# Altium schematic symbol library SCHLIB.SchLib: 2608 symbols (part 16 of 20) (continued)
## R-68.1R-0402 (continued)
RES 68.1 OHM 1% 1/16W 0402; Manufacturer Part Number: RC0402FR-0768R1L; Manufacturer: YAGEO; Tolerance: 0.01; Power: 0.063W; Temperature Coefficient: ±100ppm/°C; Object  Type: Part; Design Item ID: R-68.1R-0402; Value: 68.1R; Composition: Thick Film; Features: Moisture Resistant; Operating Temperature: -55°C ~ 155°C; Height - Seated (Max): 0.40mm; Category: Resistor
footprint R0402
pins: 1, 2

## R-68.1R-0603
designator R?, comment Package: 0603  (hidden comment: 68.1R)
RES SMD 68.1 OHM 1% 1/10W 0603; Manufacturer Part Number: CRCW060368R1FKEA; Manufacturer: Vishay Dale; Tolerance: 0.01; Power: 0.1W; Temperature Coefficient: ±100ppm/°C; Object  Type: Part; Design Item ID: R-68.1R-0603; Value: 68.1R; Composition: Thick Film; Features: Automotive AEC-Q200; Operating Temperature: -55°C ~ 155°C; Height - Seated (Max): 0.50mm; Category: Resistor
footprint R0603
pins: 1, 2

## R-68K-0402
designator R?, comment Package: 0402  (hidden comment: 68K)
RES 68K OHM 1% 1/16W 0402; Manufacturer Part Number: RC0402FR-0768KL; Manufacturer: YAGEO; Tolerance: 0.01; Power: 0.063W; Temperature Coefficient: ±100ppm/°C; Object  Type: Part; Design Item ID: R-68K-0402; Value: 68K; Composition: Thick Film; Features: Moisture Resistant; Operating Temperature: -55°C ~ 155°C; Height - Seated (Max): 0.40mm; Category: Resistor
footprint R0402
pins: 1, 2

## R-68K-0603
designator R?, comment Package: 0603  (hidden comment: 68K)
RES SMD 68K OHM 1% 1/10W 0603; Manufacturer Part Number: CRCW060368K0FKEA; Manufacturer: Vishay Dale; Tolerance: 0.01; Power: 0.1W; Temperature Coefficient: ±100ppm/°C; Object  Type: Part; Design Item ID: R-68K-0603; Value: 68K; Composition: Thick Film; Features: Automotive AEC-Q200; Operating Temperature: -55°C ~ 155°C; Height - Seated (Max): 0.50mm; Category: Resistor
footprint R0603
pins: 1, 2

## R-68mR-1206
designator R?, comment Package: 1206  (hidden comment: 68mR)
RES 0.068 OHM 1% 1/4W 1206; Manufacturer Part Number: WSL1206R0680FEA; Manufacturer: Vishay Dale; Tolerance: 0.01; Power: 0.25W; Temperature Coefficient: ±75ppm/°C; Object  Type: Part; Design Item ID: R-68mR-1206; Value: 68mR; Composition: Metal Element; Features: Anti-Sulfur, Automotive AEC-Q200, Current Sense, Moisture Resistant, Pulse Withstanding; Operating Temperature: -65°C ~ 170°C; Height - Seated (Max): 0.89mm; Category: Resistor
footprint R1206
pins: 1, 2

## R-68mR-2512
designator R?, comment Package: 2512  (hidden comment: 68mR)
RES 0.068 OHM 1% 1W 2512; Manufacturer Part Number: WSL2512R0680FEA; Manufacturer: Vishay Dale; Tolerance: 0.01; Temperature Coefficient: ±75ppm/°C; Object  Type: Part; Design Item ID: R-68mR-2512; Value: 68mR; Power: 1W; Composition: Metal Element; Features: Anti-Sulfur, Automotive AEC-Q200, Current Sense, Moisture Resistant, Pulse Withstanding; Operating Temperature: -65°C ~ 170°C; Height - Seated (Max): 0.89mm; Category: Resistor
footprint R2512
pins: 1, 2

## R-68R-0402
designator R?, comment Package: 0402  (hidden comment: 68R)
RES 68 OHM 1% 1/16W 0402; Manufacturer Part Number: RC0402FR-0768RL; Manufacturer: YAGEO; Tolerance: 0.01; Power: 0.063W; Temperature Coefficient: ±100ppm/°C; Object  Type: Part; Design Item ID: R-68R-0402; Value: 68R; Composition: Thick Film; Features: Moisture Resistant; Operating Temperature: -55°C ~ 155°C; Height - Seated (Max): 0.40mm; Category: Resistor
footprint R0402
pins: 1, 2

## R-68R-0603
designator R?, comment Package: 0603  (hidden comment: 68R)
RES SMD 68 OHM 1% 1/10W 0603; Manufacturer Part Number: CRCW060368R0FKEA; Manufacturer: Vishay Dale; Tolerance: 0.01; Power: 0.1W; Temperature Coefficient: ±100ppm/°C; Object  Type: Part; Design Item ID: R-68R-0603; Value: 68R; Composition: Thick Film; Features: Automotive AEC-Q200; Operating Temperature: -55°C ~ 155°C; Height - Seated (Max): 0.50mm; Category: Resistor
footprint R0603
pins: 1, 2

## R-69.8K-0402
designator R?, comment Package: 0402  (hidden comment: 69.8K)
RES 69.8K OHM 1% 1/16W 0402; Manufacturer Part Number: RC0402FR-0769K8L; Manufacturer: YAGEO; Tolerance: 0.01; Power: 0.063W; Temperature Coefficient: ±100ppm/°C; Object  Type: Part; Design Item ID: R-69.8K-0402; Value: 69.8K; Composition: Thick Film; Features: Moisture Resistant; Operating Temperature: -55°C ~ 155°C; Height - Seated (Max): 0.40mm; Category: Resistor
footprint R0402
pins: 1, 2

## R-69.8K-0603
designator R?, comment Package: 0603  (hidden comment: 69.8K)
RES SMD 69.8K OHM 1% 1/10W 0603; Manufacturer Part Number: CRCW060369K8FKEA; Manufacturer: Vishay Dale; Tolerance: 0.01; Power: 0.1W; Temperature Coefficient: ±100ppm/°C; Object  Type: Part; Design Item ID: R-69.8K-0603; Value: 69.8K; Composition: Thick Film; Features: Automotive AEC-Q200; Operating Temperature: -55°C ~ 155°C; Height - Seated (Max): 0.50mm; Category: Resistor
footprint R0603
pins: 1, 2

## R-69.8R-0402
designator R?, comment Package: 0402  (hidden comment: 69.8R)
RES 69.8 OHM 1% 1/16W 0402; Manufacturer Part Number: RC0402FR-0769R8L; Manufacturer: YAGEO; Tolerance: 0.01; Power: 0.063W; Temperature Coefficient: ±100ppm/°C; Object  Type: Part; Design Item ID: R-69.8R-0402; Value: 69.8R; Composition: Thick Film; Features: Moisture Resistant; Operating Temperature: -55°C ~ 155°C; Height - Seated (Max): 0.40mm; Category: Resistor
footprint R0402
pins: 1, 2

## R-69.8R-0603
designator R?, comment Package: 0603  (hidden comment: 69.8R)
RES SMD 69.8 OHM 1% 1/10W 0603; Manufacturer Part Number: CRCW060369R8FKEA; Manufacturer: Vishay Dale; Tolerance: 0.01; Power: 0.1W; Temperature Coefficient: ±100ppm/°C; Object  Type: Part; Design Item ID: R-69.8R-0603; Value: 69.8R; Composition: Thick Film; Features: Automotive AEC-Q200; Operating Temperature: -55°C ~ 155°C; Height - Seated (Max): 0.50mm; Category: Resistor
footprint R0603
pins: 1, 2

## R-70mR-1206
designator R?, comment Package: 1206  (hidden comment: 70mR)
RES 0.07 OHM 1% 1/4W 1206; Manufacturer Part Number: WSL1206R0700FEA; Manufacturer: Vishay Dale; Tolerance: 0.01; Power: 0.25W; Temperature Coefficient: ±75ppm/°C; Object  Type: Part; Design Item ID: R-70mR-1206; Value: 70mR; Composition: Metal Element; Features: Anti-Sulfur, Automotive AEC-Q200, Current Sense, Moisture Resistant, Pulse Withstanding; Operating Temperature: -65°C ~ 170°C; Height - Seated (Max): 0.89mm; Category: Resistor
footprint R1206
pins: 1, 2

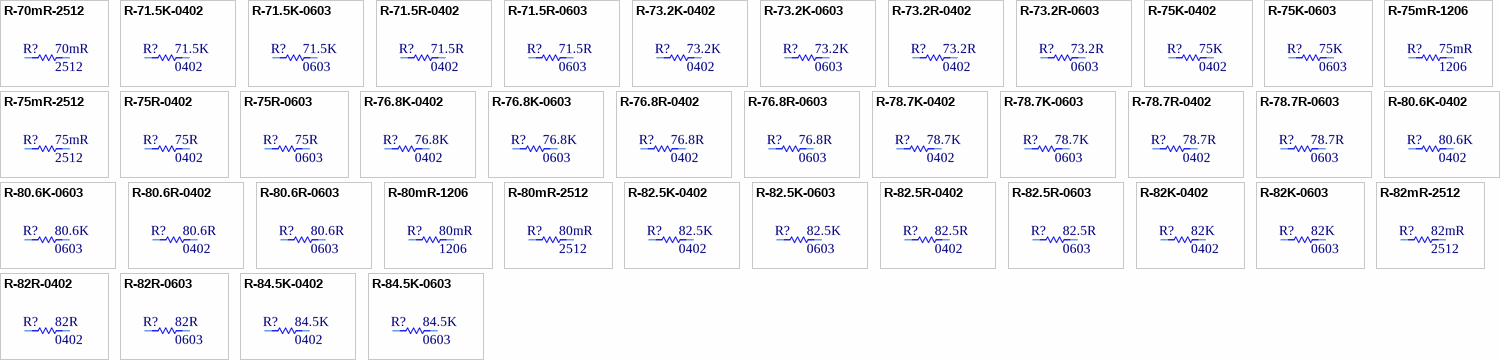
[diagram p68: symbols R-70mR-2512 to R-84.5K-0603]

## R-70mR-2512
designator R?, comment Package: 2512  (hidden comment: 70mR)
RES 0.07 OHM 1% 1W 2512; Manufacturer Part Number: WSL2512R0700FEA; Manufacturer: Vishay Dale; Tolerance: 0.01; Temperature Coefficient: ±75ppm/°C; Object  Type: Part; Design Item ID: R-70mR-2512; Value: 70mR; Power: 1W; Composition: Metal Element; Features: Anti-Sulfur, Automotive AEC-Q200, Current Sense, Moisture Resistant, Pulse Withstanding; Operating Temperature: -65°C ~ 170°C; Height - Seated (Max): 0.89mm; Category: Resistor
footprint R2512
pins: 1, 2

## R-71.5K-0402
designator R?, comment Package: 0402  (hidden comment: 71.5K)
RES 71.5K OHM 1% 1/16W 0402; Manufacturer Part Number: RC0402FR-0771K5L; Manufacturer: YAGEO; Tolerance: 0.01; Power: 0.063W; Temperature Coefficient: ±100ppm/°C; Object  Type: Part; Design Item ID: R-71.5K-0402; Value: 71.5K; Composition: Thick Film; Features: Moisture Resistant; Operating Temperature: -55°C ~ 155°C; Height - Seated (Max): 0.40mm; Category: Resistor
footprint R0402
pins: 1, 2

## R-71.5K-0603
designator R?, comment Package: 0603  (hidden comment: 71.5K)
RES SMD 71.5K OHM 1% 1/10W 0603; Manufacturer Part Number: CRCW060371K5FKEA; Manufacturer: Vishay Dale; Tolerance: 0.01; Power: 0.1W; Temperature Coefficient: ±100ppm/°C; Object  Type: Part; Design Item ID: R-71.5K-0603; Value: 71.5K; Composition: Thick Film; Features: Automotive AEC-Q200; Operating Temperature: -55°C ~ 155°C; Height - Seated (Max): 0.50mm; Category: Resistor
footprint R0603
pins: 1, 2

## R-71.5R-0402
designator R?, comment Package: 0402  (hidden comment: 71.5R)
RES 71.5 OHM 1% 1/16W 0402; Manufacturer Part Number: RC0402FR-0771R5L; Manufacturer: YAGEO; Tolerance: 0.01; Power: 0.063W; Temperature Coefficient: ±100ppm/°C; Object  Type: Part; Design Item ID: R-71.5R-0402; Value: 71.5R; Composition: Thick Film; Features: Moisture Resistant; Operating Temperature: -55°C ~ 155°C; Height - Seated (Max): 0.40mm; Category: Resistor
footprint R0402
pins: 1, 2

## R-71.5R-0603
designator R?, comment Package: 0603  (hidden comment: 71.5R)
RES SMD 71.5 OHM 1% 1/10W 0603; Manufacturer Part Number: CRCW060371R5FKEA; Manufacturer: Vishay Dale; Tolerance: 0.01; Power: 0.1W; Temperature Coefficient: ±100ppm/°C; Object  Type: Part; Design Item ID: R-71.5R-0603; Value: 71.5R; Composition: Thick Film; Features: Automotive AEC-Q200; Operating Temperature: -55°C ~ 155°C; Height - Seated (Max): 0.50mm; Category: Resistor
footprint R0603
pins: 1, 2

## R-73.2K-0402
designator R?, comment Package: 0402  (hidden comment: 73.2K)
RES 73.2K OHM 1% 1/16W 0402; Manufacturer Part Number: RC0402FR-0773K2L; Manufacturer: YAGEO; Tolerance: 0.01; Power: 0.063W; Temperature Coefficient: ±100ppm/°C; Object  Type: Part; Design Item ID: R-73.2K-0402; Value: 73.2K; Composition: Thick Film; Features: Moisture Resistant; Operating Temperature: -55°C ~ 155°C; Height - Seated (Max): 0.40mm; Category: Resistor
footprint R0402
pins: 1, 2

## R-73.2K-0603
designator R?, comment Package: 0603  (hidden comment: 73.2K)
RES SMD 73.2K OHM 1% 1/10W 0603; Manufacturer Part Number: CRCW060373K2FKEA; Manufacturer: Vishay Dale; Tolerance: 0.01; Power: 0.1W; Temperature Coefficient: ±100ppm/°C; Object  Type: Part; Design Item ID: R-73.2K-0603; Value: 73.2K; Composition: Thick Film; Features: Automotive AEC-Q200; Operating Temperature: -55°C ~ 155°C; Height - Seated (Max): 0.50mm; Category: Resistor
footprint R0603
pins: 1, 2

## R-73.2R-0402
designator R?, comment Package: 0402  (hidden comment: 73.2R)
RES 73.2 OHM 1% 1/16W 0402; Manufacturer Part Number: RC0402FR-0773R2L; Manufacturer: YAGEO; Tolerance: 0.01; Power: 0.063W; Temperature Coefficient: ±100ppm/°C; Object  Type: Part; Design Item ID: R-73.2R-0402; Value: 73.2R; Composition: Thick Film; Features: Moisture Resistant; Operating Temperature: -55°C ~ 155°C; Height - Seated (Max): 0.40mm; Category: Resistor
footprint R0402
pins: 1, 2

## R-73.2R-0603
designator R?, comment Package: 0603  (hidden comment: 73.2R)
RES SMD 73.2 OHM 1% 1/10W 0603; Manufacturer Part Number: CRCW060373R2FKEA; Manufacturer: Vishay Dale; Tolerance: 0.01; Power: 0.1W; Temperature Coefficient: ±100ppm/°C; Object  Type: Part; Design Item ID: R-73.2R-0603; Value: 73.2R; Composition: Thick Film; Features: Automotive AEC-Q200; Operating Temperature: -55°C ~ 155°C; Height - Seated (Max): 0.50mm; Category: Resistor
footprint R0603
pins: 1, 2

## R-75K-0402
designator R?, comment Package: 0402  (hidden comment: 75K)
RES 75K OHM 1% 1/16W 0402; Manufacturer Part Number: RC0402FR-0775KL; Manufacturer: YAGEO; Tolerance: 0.01; Power: 0.063W; Temperature Coefficient: ±100ppm/°C; Object  Type: Part; Design Item ID: R-75K-0402; Value: 75K; Composition: Thick Film; Features: Moisture Resistant; Operating Temperature: -55°C ~ 155°C; Height - Seated (Max): 0.40mm; Category: Resistor
footprint R0402
pins: 1, 2

## R-75K-0603
designator R?, comment Package: 0603  (hidden comment: 75K)
RES SMD 75K OHM 1% 1/10W 0603; Manufacturer Part Number: CRCW060375K0FKEA; Manufacturer: Vishay Dale; Tolerance: 0.01; Power: 0.1W; Temperature Coefficient: ±100ppm/°C; Object  Type: Part; Design Item ID: R-75K-0603; Value: 75K; Composition: Thick Film; Features: Automotive AEC-Q200; Operating Temperature: -55°C ~ 155°C; Height - Seated (Max): 0.50mm; Category: Resistor
footprint R0603
pins: 1, 2

## R-75mR-1206
designator R?, comment Package: 1206  (hidden comment: 75mR)
RES 0.075 OHM 1% 1/4W 1206; Manufacturer Part Number: WSL1206R0750FEA; Manufacturer: Vishay Dale; Tolerance: 0.01; Power: 0.25W; Temperature Coefficient: ±75ppm/°C; Object  Type: Part; Design Item ID: R-75mR-1206; Value: 75mR; Composition: Metal Element; Features: Anti-Sulfur, Automotive AEC-Q200, Current Sense, Moisture Resistant, Pulse Withstanding; Operating Temperature: -65°C ~ 170°C; Height - Seated (Max): 0.89mm; Category: Resistor
footprint R1206
pins: 1, 2

## R-75mR-2512
designator R?, comment Package: 2512  (hidden comment: 75mR)
RES 0.075 OHM 1% 1W 2512; Manufacturer Part Number: WSL2512R0750FEA; Manufacturer: Vishay Dale; Tolerance: 0.01; Temperature Coefficient: ±75ppm/°C; Object  Type: Part; Design Item ID: R-75mR-2512; Value: 75mR; Power: 1W; Composition: Metal Element; Features: Anti-Sulfur, Automotive AEC-Q200, Current Sense, Moisture Resistant, Pulse Withstanding; Operating Temperature: -65°C ~ 170°C; Height - Seated (Max): 0.89mm; Category: Resistor
footprint R2512
pins: 1, 2

## R-75R-0402
designator R?, comment Package: 0402  (hidden comment: 75R)
RES 75 OHM 1% 1/16W 0402; Manufacturer Part Number: RC0402FR-0775RL; Manufacturer: YAGEO; Tolerance: 0.01; Power: 0.063W; Temperature Coefficient: ±100ppm/°C; Object  Type: Part; Design Item ID: R-75R-0402; Value: 75R; Composition: Thick Film; Features: Moisture Resistant; Operating Temperature: -55°C ~ 155°C; Height - Seated (Max): 0.40mm; Category: Resistor
footprint R0402
pins: 1, 2

## R-75R-0603
designator R?, comment Package: 0603  (hidden comment: 75R)
RES SMD 75 OHM 1% 1/10W 0603; Manufacturer Part Number: CRCW060375R0FKEA; Manufacturer: Vishay Dale; Tolerance: 0.01; Power: 0.1W; Temperature Coefficient: ±100ppm/°C; Object  Type: Part; Design Item ID: R-75R-0603; Value: 75R; Composition: Thick Film; Features: Automotive AEC-Q200; Operating Temperature: -55°C ~ 155°C; Height - Seated (Max): 0.50mm; Category: Resistor
footprint R0603
pins: 1, 2

## R-76.8K-0402
designator R?, comment Package: 0402  (hidden comment: 76.8K)
RES 76.8K OHM 1% 1/16W 0402; Manufacturer Part Number: RC0402FR-0776K8L; Manufacturer: YAGEO; Tolerance: 0.01; Power: 0.063W; Temperature Coefficient: ±100ppm/°C; Object  Type: Part; Design Item ID: R-76.8K-0402; Value: 76.8K; Composition: Thick Film; Features: Moisture Resistant; Operating Temperature: -55°C ~ 155°C; Height - Seated (Max): 0.40mm; Category: Resistor
footprint R0402
pins: 1, 2

## R-76.8K-0603
designator R?, comment Package: 0603  (hidden comment: 76.8K)
RES SMD 76.8K OHM 1% 1/10W 0603; Manufacturer Part Number: CRCW060376K8FKEA; Manufacturer: Vishay Dale; Tolerance: 0.01; Power: 0.1W; Temperature Coefficient: ±100ppm/°C; Object  Type: Part; Design Item ID: R-76.8K-0603; Value: 76.8K; Composition: Thick Film; Features: Automotive AEC-Q200; Operating Temperature: -55°C ~ 155°C; Height - Seated (Max): 0.50mm; Category: Resistor
footprint R0603
pins: 1, 2

## R-76.8R-0402
designator R?, comment Package: 0402  (hidden comment: 76.8R)
RES 76.8 OHM 1% 1/16W 0402; Manufacturer Part Number: RC0402FR-0776R8L; Manufacturer: YAGEO; Tolerance: 0.01; Power: 0.063W; Temperature Coefficient: ±100ppm/°C; Object  Type: Part; Design Item ID: R-76.8R-0402; Value: 76.8R; Composition: Thick Film; Features: Moisture Resistant; Operating Temperature: -55°C ~ 155°C; Height - Seated (Max): 0.40mm; Category: Resistor
footprint R0402
pins: 1, 2

## R-76.8R-0603
designator R?, comment Package: 0603  (hidden comment: 76.8R)
RES SMD 76.8 OHM 1% 1/10W 0603; Manufacturer Part Number: CRCW060376R8FKEA; Manufacturer: Vishay Dale; Tolerance: 0.01; Power: 0.1W; Temperature Coefficient: ±100ppm/°C; Object  Type: Part; Design Item ID: R-76.8R-0603; Value: 76.8R; Composition: Thick Film; Features: Automotive AEC-Q200; Operating Temperature: -55°C ~ 155°C; Height - Seated (Max): 0.50mm; Category: Resistor
footprint R0603
pins: 1, 2

## R-78.7K-0402
designator R?, comment Package: 0402  (hidden comment: 78.7K)
RES 78.7K OHM 1% 1/16W 0402; Manufacturer Part Number: RC0402FR-0778K7L; Manufacturer: YAGEO; Tolerance: 0.01; Power: 0.063W; Temperature Coefficient: ±100ppm/°C; Object  Type: Part; Design Item ID: R-78.7K-0402; Value: 78.7K; Composition: Thick Film; Features: Moisture Resistant; Operating Temperature: -55°C ~ 155°C; Height - Seated (Max): 0.40mm; Category: Resistor
footprint R0402
pins: 1, 2

## R-78.7K-0603
designator R?, comment Package: 0603  (hidden comment: 78.7K)
RES SMD 78.7K OHM 1% 1/10W 0603; Manufacturer Part Number: CRCW060378K7FKEA; Manufacturer: Vishay Dale; Tolerance: 0.01; Power: 0.1W; Temperature Coefficient: ±100ppm/°C; Object  Type: Part; Design Item ID: R-78.7K-0603; Value: 78.7K; Composition: Thick Film; Features: Automotive AEC-Q200; Operating Temperature: -55°C ~ 155°C; Height - Seated (Max): 0.50mm; Category: Resistor
footprint R0603
pins: 1, 2

## R-78.7R-0402
designator R?, comment Package: 0402  (hidden comment: 78.7R)
RES 78.7 OHM 1% 1/16W 0402; Manufacturer Part Number: RC0402FR-0778R7L; Manufacturer: YAGEO; Tolerance: 0.01; Power: 0.063W; Temperature Coefficient: ±100ppm/°C; Object  Type: Part; Design Item ID: R-78.7R-0402; Value: 78.7R; Composition: Thick Film; Features: Moisture Resistant; Operating Temperature: -55°C ~ 155°C; Height - Seated (Max): 0.40mm; Category: Resistor
footprint R0402
pins: 1, 2

## R-78.7R-0603
designator R?, comment Package: 0603  (hidden comment: 78.7R)
RES SMD 78.7 OHM 1% 1/10W 0603; Manufacturer Part Number: CRCW060378R7FKEA; Manufacturer: Vishay Dale; Tolerance: 0.01; Power: 0.1W; Temperature Coefficient: ±100ppm/°C; Object  Type: Part; Design Item ID: R-78.7R-0603; Value: 78.7R; Composition: Thick Film; Features: Automotive AEC-Q200; Operating Temperature: -55°C ~ 155°C; Height - Seated (Max): 0.50mm; Category: Resistor
footprint R0603
pins: 1, 2

## R-80.6K-0402
designator R?, comment Package: 0402  (hidden comment: 80.6K)
RES 80.6K OHM 1% 1/16W 0402; Manufacturer Part Number: RC0402FR-0780K6L; Manufacturer: YAGEO; Tolerance: 0.01; Power: 0.063W; Temperature Coefficient: ±100ppm/°C; Object  Type: Part; Design Item ID: R-80.6K-0402; Value: 80.6K; Composition: Thick Film; Features: Moisture Resistant; Operating Temperature: -55°C ~ 155°C; Height - Seated (Max): 0.40mm; Category: Resistor
footprint R0402
pins: 1, 2

## R-80.6K-0603
designator R?, comment Package: 0603  (hidden comment: 80.6K)
RES SMD 80.6K OHM 1% 1/10W 0603; Manufacturer Part Number: CRCW060380K6FKEA; Manufacturer: Vishay Dale; Tolerance: 0.01; Power: 0.1W; Temperature Coefficient: ±100ppm/°C; Object  Type: Part; Design Item ID: R-80.6K-0603; Value: 80.6K; Composition: Thick Film; Features: Automotive AEC-Q200; Operating Temperature: -55°C ~ 155°C; Height - Seated (Max): 0.50mm; Category: Resistor
footprint R0603
pins: 1, 2

## R-80.6R-0402
designator R?, comment Package: 0402  (hidden comment: 80.6R)
RES 80.6 OHM 1% 1/16W 0402; Manufacturer Part Number: RC0402FR-0780R6L; Manufacturer: YAGEO; Tolerance: 0.01; Power: 0.063W; Temperature Coefficient: ±100ppm/°C; Object  Type: Part; Design Item ID: R-80.6R-0402; Value: 80.6R; Composition: Thick Film; Features: Moisture Resistant; Operating Temperature: -55°C ~ 155°C; Height - Seated (Max): 0.40mm; Category: Resistor
footprint R0402
pins: 1, 2

## R-80.6R-0603
designator R?, comment Package: 0603  (hidden comment: 80.6R)
RES SMD 80.6 OHM 1% 1/10W 0603; Manufacturer Part Number: CRCW060380R6FKEA; Manufacturer: Vishay Dale; Tolerance: 0.01; Power: 0.1W; Temperature Coefficient: ±100ppm/°C; Object  Type: Part; Design Item ID: R-80.6R-0603; Value: 80.6R; Composition: Thick Film; Features: Automotive AEC-Q200; Operating Temperature: -55°C ~ 155°C; Height - Seated (Max): 0.50mm; Category: Resistor
footprint R0603
pins: 1, 2

## R-80mR-1206
designator R?, comment Package: 1206  (hidden comment: 80mR)
RES 0.08 OHM 1% 1/4W 1206; Manufacturer Part Number: WSL1206R0800FEA; Manufacturer: Vishay Dale; Tolerance: 0.01; Power: 0.25W; Temperature Coefficient: ±75ppm/°C; Object  Type: Part; Design Item ID: R-80mR-1206; Value: 80mR; Composition: Metal Element; Features: Anti-Sulfur, Automotive AEC-Q200, Current Sense, Moisture Resistant, Pulse Withstanding; Operating Temperature: -65°C ~ 170°C; Height - Seated (Max): 0.89mm; Category: Resistor
footprint R1206
pins: 1, 2

## R-80mR-2512
designator R?, comment Package: 2512  (hidden comment: 80mR)
RES 0.08 OHM 1% 1W 2512; Manufacturer Part Number: WSL2512R0800FEA; Manufacturer: Vishay Dale; Tolerance: 0.01; Temperature Coefficient: ±75ppm/°C; Object  Type: Part; Design Item ID: R-80mR-2512; Value: 80mR; Power: 1W; Composition: Metal Element; Features: Anti-Sulfur, Automotive AEC-Q200, Current Sense, Moisture Resistant, Pulse Withstanding; Operating Temperature: -65°C ~ 170°C; Height - Seated (Max): 0.89mm; Category: Resistor
footprint R2512
pins: 1, 2

## R-82.5K-0402
designator R?, comment Package: 0402  (hidden comment: 82.5K)
RES 82.5K OHM 1% 1/16W 0402; Manufacturer Part Number: RC0402FR-0782K5L; Manufacturer: YAGEO; Tolerance: 0.01; Power: 0.063W; Temperature Coefficient: ±100ppm/°C; Object  Type: Part; Design Item ID: R-82.5K-0402; Value: 82.5K; Composition: Thick Film; Features: Moisture Resistant; Operating Temperature: -55°C ~ 155°C; Height - Seated (Max): 0.40mm; Category: Resistor
footprint R0402
pins: 1, 2

## R-82.5K-0603
designator R?, comment Package: 0603  (hidden comment: 82.5K)
RES SMD 82.5K OHM 1% 1/10W 0603; Manufacturer Part Number: CRCW060382K5FKEA; Manufacturer: Vishay Dale; Tolerance: 0.01; Power: 0.1W; Temperature Coefficient: ±100ppm/°C; Object  Type: Part; Design Item ID: R-82.5K-0603; Value: 82.5K; Composition: Thick Film; Features: Automotive AEC-Q200; Operating Temperature: -55°C ~ 155°C; Height - Seated (Max): 0.50mm; Category: Resistor
footprint R0603
pins: 1, 2

## R-82.5R-0402
designator R?, comment Package: 0402  (hidden comment: 82.5R)
RES 82.5 OHM 1% 1/16W 0402; Manufacturer Part Number: RC0402FR-0782R5L; Manufacturer: YAGEO; Tolerance: 0.01; Power: 0.063W; Temperature Coefficient: ±100ppm/°C; Object  Type: Part; Design Item ID: R-82.5R-0402; Value: 82.5R; Composition: Thick Film; Features: Moisture Resistant; Operating Temperature: -55°C ~ 155°C; Height - Seated (Max): 0.40mm; Category: Resistor
footprint R0402
pins: 1, 2

## R-82.5R-0603
designator R?, comment Package: 0603  (hidden comment: 82.5R)
RES SMD 82.5 OHM 1% 1/10W 0603; Manufacturer Part Number: CRCW060382R5FKEA; Manufacturer: Vishay Dale; Tolerance: 0.01; Power: 0.1W; Temperature Coefficient: ±100ppm/°C; Object  Type: Part; Design Item ID: R-82.5R-0603; Value: 82.5R; Composition: Thick Film; Features: Automotive AEC-Q200; Operating Temperature: -55°C ~ 155°C; Height - Seated (Max): 0.50mm; Category: Resistor
footprint R0603
pins: 1, 2

## R-82K-0402
designator R?, comment Package: 0402  (hidden comment: 82K)
RES 82K OHM 1% 1/16W 0402; Manufacturer Part Number: RC0402FR-0782KL; Manufacturer: YAGEO; Tolerance: 0.01; Power: 0.063W; Temperature Coefficient: ±100ppm/°C; Object  Type: Part; Design Item ID: R-82K-0402; Value: 82K; Composition: Thick Film; Features: Moisture Resistant; Operating Temperature: -55°C ~ 155°C; Height - Seated (Max): 0.40mm; Category: Resistor
footprint R0402
pins: 1, 2

## R-82K-0603
designator R?, comment Package: 0603  (hidden comment: 82K)
RES SMD 82K OHM 1% 1/10W 0603; Manufacturer Part Number: CRCW060382K0FKEA; Manufacturer: Vishay Dale; Tolerance: 0.01; Power: 0.1W; Temperature Coefficient: ±100ppm/°C; Object  Type: Part; Design Item ID: R-82K-0603; Value: 82K; Composition: Thick Film; Features: Automotive AEC-Q200; Operating Temperature: -55°C ~ 155°C; Height - Seated (Max): 0.50mm; Category: Resistor
footprint R0603
pins: 1, 2

## R-82mR-2512
designator R?, comment Package: 2512  (hidden comment: 82mR)
RES 0.082 OHM 1% 1W 2512; Manufacturer Part Number: WSL2512R0820FEA; Manufacturer: Vishay Dale; Tolerance: 0.01; Temperature Coefficient: ±75ppm/°C; Object  Type: Part; Design Item ID: R-82mR-2512; Value: 82mR; Power: 1W; Composition: Metal Element; Features: Anti-Sulfur, Automotive AEC-Q200, Current Sense, Moisture Resistant, Pulse Withstanding; Operating Temperature: -65°C ~ 170°C; Height - Seated (Max): 0.89mm; Category: Resistor
footprint R2512
pins: 1, 2

## R-82R-0402
designator R?, comment Package: 0402  (hidden comment: 82R)
RES 82 OHM 1% 1/16W 0402; Manufacturer Part Number: RC0402FR-0782RL; Manufacturer: YAGEO; Tolerance: 0.01; Power: 0.063W; Temperature Coefficient: ±100ppm/°C; Object  Type: Part; Design Item ID: R-82R-0402; Value: 82R; Composition: Thick Film; Features: Moisture Resistant; Operating Temperature: -55°C ~ 155°C; Height - Seated (Max): 0.40mm; Category: Resistor
footprint R0402
pins: 1, 2

## R-82R-0603
designator R?, comment Package: 0603  (hidden comment: 82R)
RES SMD 82 OHM 1% 1/10W 0603; Manufacturer Part Number: CRCW060382R0FKEA; Manufacturer: Vishay Dale; Tolerance: 0.01; Power: 0.1W; Temperature Coefficient: ±100ppm/°C; Object  Type: Part; Design Item ID: R-82R-0603; Value: 82R; Composition: Thick Film; Features: Automotive AEC-Q200; Operating Temperature: -55°C ~ 155°C; Height - Seated (Max): 0.50mm; Category: Resistor
footprint R0603
pins: 1, 2

## R-84.5K-0402
designator R?, comment Package: 0402  (hidden comment: 84.5K)
RES 84.5K OHM 1% 1/16W 0402; Manufacturer Part Number: RC0402FR-0784K5L; Manufacturer: YAGEO; Tolerance: 0.01; Power: 0.063W; Temperature Coefficient: ±100ppm/°C; Object  Type: Part; Design Item ID: R-84.5K-0402; Value: 84.5K; Composition: Thick Film; Features: Moisture Resistant; Operating Temperature: -55°C ~ 155°C; Height - Seated (Max): 0.40mm; Category: Resistor
footprint R0402
pins: 1, 2

## R-84.5K-0603
designator R?, comment Package: 0603  (hidden comment: 84.5K)
RES SMD 84.5K OHM 1% 1/10W 0603; Manufacturer Part Number: CRCW060384K5FKEA; Manufacturer: Vishay Dale; Tolerance: 0.01; Power: 0.1W; Temperature Coefficient: ±100ppm/°C; Object  Type: Part; Design Item ID: R-84.5K-0603; Value: 84.5K; Composition: Thick Film; Features: Automotive AEC-Q200; Operating Temperature: -55°C ~ 155°C; Height - Seated (Max): 0.50mm; Category: Resistor
footprint R0603
pins: 1, 2

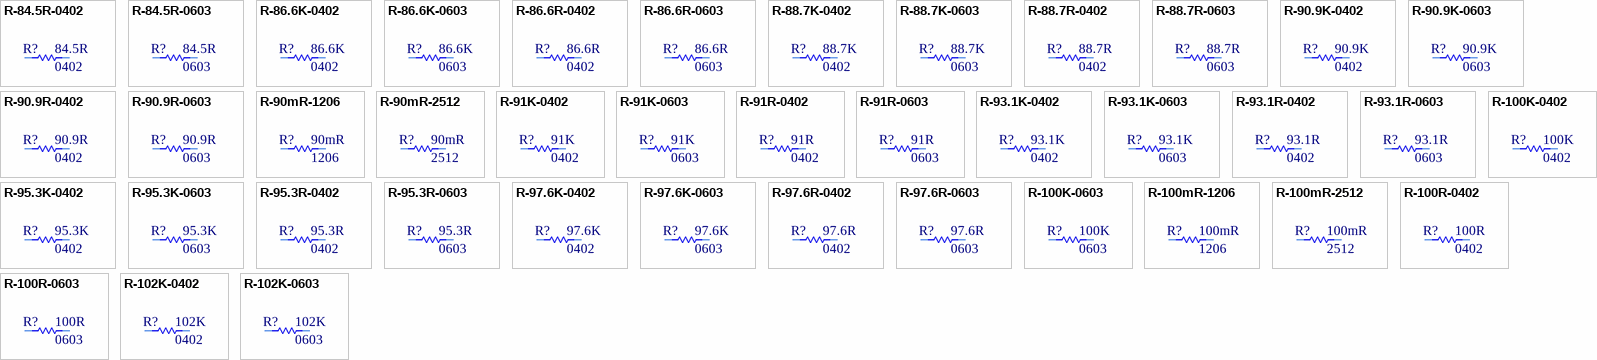
[diagram p69: symbols R-84.5R-0402 to R-102K-0603]

## R-84.5R-0402
designator R?, comment Package: 0402  (hidden comment: 84.5R)
RES 84.5 OHM 1% 1/16W 0402; Manufacturer Part Number: RC0402FR-0784R5L; Manufacturer: YAGEO; Tolerance: 0.01; Power: 0.063W; Temperature Coefficient: ±100ppm/°C; Object  Type: Part; Design Item ID: R-84.5R-0402; Value: 84.5R; Composition: Thick Film; Features: Moisture Resistant; Operating Temperature: -55°C ~ 155°C; Height - Seated (Max): 0.40mm; Category: Resistor
footprint R0402
pins: 1, 2

## R-84.5R-0603
designator R?, comment Package: 0603  (hidden comment: 84.5R)
RES SMD 84.5 OHM 1% 1/10W 0603; Manufacturer Part Number: CRCW060384R5FKEA; Manufacturer: Vishay Dale; Tolerance: 0.01; Power: 0.1W; Temperature Coefficient: ±100ppm/°C; Object  Type: Part; Design Item ID: R-84.5R-0603; Value: 84.5R; Composition: Thick Film; Features: Automotive AEC-Q200; Operating Temperature: -55°C ~ 155°C; Height - Seated (Max): 0.50mm; Category: Resistor
footprint R0603
pins: 1, 2

## R-86.6K-0402
designator R?, comment Package: 0402  (hidden comment: 86.6K)
RES 86.6K OHM 1% 1/16W 0402; Manufacturer Part Number: RC0402FR-0786K6L; Manufacturer: YAGEO; Tolerance: 0.01; Power: 0.063W; Temperature Coefficient: ±100ppm/°C; Object  Type: Part; Design Item ID: R-86.6K-0402; Value: 86.6K; Composition: Thick Film; Features: Moisture Resistant; Operating Temperature: -55°C ~ 155°C; Height - Seated (Max): 0.40mm; Category: Resistor
footprint R0402
pins: 1, 2

## R-86.6K-0603
designator R?, comment Package: 0603  (hidden comment: 86.6K)
RES SMD 86.6K OHM 1% 1/10W 0603; Manufacturer Part Number: CRCW060386K6FKEA; Manufacturer: Vishay Dale; Tolerance: 0.01; Power: 0.1W; Temperature Coefficient: ±100ppm/°C; Object  Type: Part; Design Item ID: R-86.6K-0603; Value: 86.6K; Composition: Thick Film; Features: Automotive AEC-Q200; Operating Temperature: -55°C ~ 155°C; Height - Seated (Max): 0.50mm; Category: Resistor
footprint R0603
pins: 1, 2

## R-86.6R-0402
designator R?, comment Package: 0402  (hidden comment: 86.6R)
RES 86.6 OHM 1% 1/16W 0402; Manufacturer Part Number: RC0402FR-0786R6L; Manufacturer: YAGEO; Tolerance: 0.01; Power: 0.063W; Temperature Coefficient: ±100ppm/°C; Object  Type: Part; Design Item ID: R-86.6R-0402; Value: 86.6R; Composition: Thick Film; Features: Moisture Resistant; Operating Temperature: -55°C ~ 155°C; Height - Seated (Max): 0.40mm; Category: Resistor
footprint R0402
pins: 1, 2

## R-86.6R-0603
designator R?, comment Package: 0603  (hidden comment: 86.6R)
RES SMD 86.6 OHM 1% 1/10W 0603; Manufacturer Part Number: CRCW060386R6FKEA; Manufacturer: Vishay Dale; Tolerance: 0.01; Power: 0.1W; Temperature Coefficient: ±100ppm/°C; Object  Type: Part; Design Item ID: R-86.6R-0603; Value: 86.6R; Composition: Thick Film; Features: Automotive AEC-Q200; Operating Temperature: -55°C ~ 155°C; Height - Seated (Max): 0.50mm; Category: Resistor
footprint R0603
pins: 1, 2

## R-88.7K-0402
designator R?, comment Package: 0402  (hidden comment: 88.7K)
RES 88.7K OHM 1% 1/16W 0402; Manufacturer Part Number: RC0402FR-0788K7L; Manufacturer: YAGEO; Tolerance: 0.01; Power: 0.063W; Temperature Coefficient: ±100ppm/°C; Object  Type: Part; Design Item ID: R-88.7K-0402; Value: 88.7K; Composition: Thick Film; Features: Moisture Resistant; Operating Temperature: -55°C ~ 155°C; Height - Seated (Max): 0.40mm; Category: Resistor
footprint R0402
pins: 1, 2

## R-88.7K-0603
designator R?, comment Package: 0603  (hidden comment: 88.7K)
RES SMD 88.7K OHM 1% 1/10W 0603; Manufacturer Part Number: CRCW060388K7FKEA; Manufacturer: Vishay Dale; Tolerance: 0.01; Power: 0.1W; Temperature Coefficient: ±100ppm/°C; Object  Type: Part; Design Item ID: R-88.7K-0603; Value: 88.7K; Composition: Thick Film; Features: Automotive AEC-Q200; Operating Temperature: -55°C ~ 155°C; Height - Seated (Max): 0.50mm; Category: Resistor
footprint R0603
pins: 1, 2

## R-88.7R-0402
designator R?, comment Package: 0402  (hidden comment: 88.7R)
RES 88.7 OHM 1% 1/16W 0402; Manufacturer Part Number: RC0402FR-0788R7L; Manufacturer: YAGEO; Tolerance: 0.01; Power: 0.063W; Temperature Coefficient: ±100ppm/°C; Object  Type: Part; Design Item ID: R-88.7R-0402; Value: 88.7R; Composition: Thick Film; Features: Moisture Resistant; Operating Temperature: -55°C ~ 155°C; Height - Seated (Max): 0.40mm; Category: Resistor
footprint R0402
pins: 1, 2

## R-88.7R-0603
designator R?, comment Package: 0603  (hidden comment: 88.7R)
RES SMD 88.7 OHM 1% 1/10W 0603; Manufacturer Part Number: CRCW060388R7FKEA; Manufacturer: Vishay Dale; Tolerance: 0.01; Power: 0.1W; Temperature Coefficient: ±100ppm/°C; Object  Type: Part; Design Item ID: R-88.7R-0603; Value: 88.7R; Composition: Thick Film; Features: Automotive AEC-Q200; Operating Temperature: -55°C ~ 155°C; Height - Seated (Max): 0.50mm; Category: Resistor
footprint R0603
pins: 1, 2

## R-90.9K-0402
designator R?, comment Package: 0402  (hidden comment: 90.9K)
RES 90.9K OHM 1% 1/16W 0402; Manufacturer Part Number: RC0402FR-0790K9L; Manufacturer: YAGEO; Tolerance: 0.01; Power: 0.063W; Temperature Coefficient: ±100ppm/°C; Object  Type: Part; Design Item ID: R-90.9K-0402; Value: 90.9K; Composition: Thick Film; Features: Moisture Resistant; Operating Temperature: -55°C ~ 155°C; Height - Seated (Max): 0.40mm; Category: Resistor
footprint R0402
pins: 1, 2

## R-90.9K-0603
designator R?, comment Package: 0603  (hidden comment: 90.9K)
RES SMD 90.9K OHM 1% 1/10W 0603; Manufacturer Part Number: CRCW060390K9FKEA; Manufacturer: Vishay Dale; Tolerance: 0.01; Power: 0.1W; Temperature Coefficient: ±100ppm/°C; Object  Type: Part; Design Item ID: R-90.9K-0603; Value: 90.9K; Composition: Thick Film; Features: Automotive AEC-Q200; Operating Temperature: -55°C ~ 155°C; Height - Seated (Max): 0.50mm; Category: Resistor
footprint R0603
pins: 1, 2

## R-90.9R-0402
designator R?, comment Package: 0402  (hidden comment: 90.9R)
RES 90.9 OHM 1% 1/16W 0402; Manufacturer Part Number: RC0402FR-0790R9L; Manufacturer: YAGEO; Tolerance: 0.01; Power: 0.063W; Temperature Coefficient: ±100ppm/°C; Object  Type: Part; Design Item ID: R-90.9R-0402; Value: 90.9R; Composition: Thick Film; Features: Moisture Resistant; Operating Temperature: -55°C ~ 155°C; Height - Seated (Max): 0.40mm; Category: Resistor
footprint R0402
pins: 1, 2

## R-90.9R-0603
designator R?, comment Package: 0603  (hidden comment: 90.9R)
RES SMD 90.9 OHM 1% 1/10W 0603; Manufacturer Part Number: CRCW060390R9FKEA; Manufacturer: Vishay Dale; Tolerance: 0.01; Power: 0.1W; Temperature Coefficient: ±100ppm/°C; Object  Type: Part; Design Item ID: R-90.9R-0603; Value: 90.9R; Composition: Thick Film; Features: Automotive AEC-Q200; Operating Temperature: -55°C ~ 155°C; Height - Seated (Max): 0.50mm; Category: Resistor
footprint R0603
pins: 1, 2

## R-90mR-1206
designator R?, comment Package: 1206  (hidden comment: 90mR)
RES 0.09 OHM 1% 1/4W 1206; Manufacturer Part Number: WSL1206R0900FEA; Manufacturer: Vishay Dale; Tolerance: 0.01; Power: 0.25W; Temperature Coefficient: ±75ppm/°C; Object  Type: Part; Design Item ID: R-90mR-1206; Value: 90mR; Composition: Metal Element; Features: Anti-Sulfur, Automotive AEC-Q200, Current Sense, Moisture Resistant, Pulse Withstanding; Operating Temperature: -65°C ~ 170°C; Height - Seated (Max): 0.89mm; Category: Resistor
footprint R1206
pins: 1, 2

## R-90mR-2512
designator R?, comment Package: 2512  (hidden comment: 90mR)
RES 0.09 OHM 1% 1W 2512; Manufacturer Part Number: WSL2512R0900FEA; Manufacturer: Vishay Dale; Tolerance: 0.01; Temperature Coefficient: ±75ppm/°C; Object  Type: Part; Design Item ID: R-90mR-2512; Value: 90mR; Power: 1W; Composition: Metal Element; Features: Anti-Sulfur, Automotive AEC-Q200, Current Sense, Moisture Resistant, Pulse Withstanding; Operating Temperature: -65°C ~ 170°C; Height - Seated (Max): 0.89mm; Category: Resistor
footprint R2512
pins: 1, 2

## R-91K-0402
designator R?, comment Package: 0402  (hidden comment: 91K)
RES 91K OHM 1% 1/16W 0402; Manufacturer Part Number: RC0402FR-0791KL; Manufacturer: YAGEO; Tolerance: 0.01; Power: 0.063W; Temperature Coefficient: ±100ppm/°C; Object  Type: Part; Design Item ID: R-91K-0402; Value: 91K; Composition: Thick Film; Features: Moisture Resistant; Operating Temperature: -55°C ~ 155°C; Height - Seated (Max): 0.40mm; Category: Resistor
footprint R0402
pins: 1, 2

## R-91K-0603
designator R?, comment Package: 0603  (hidden comment: 91K)
RES SMD 91K OHM 1% 1/10W 0603; Manufacturer Part Number: CRCW060391K0FKEA; Manufacturer: Vishay Dale; Tolerance: 0.01; Power: 0.1W; Temperature Coefficient: ±100ppm/°C; Object  Type: Part; Design Item ID: R-91K-0603; Value: 91K; Composition: Thick Film; Features: Automotive AEC-Q200; Operating Temperature: -55°C ~ 155°C; Height - Seated (Max): 0.50mm; Category: Resistor
footprint R0603
pins: 1, 2

## R-91R-0402
designator R?, comment Package: 0402  (hidden comment: 91R)
RES 91 OHM 1% 1/16W 0402; Manufacturer Part Number: RC0402FR-0791RL; Manufacturer: YAGEO; Tolerance: 0.01; Power: 0.063W; Temperature Coefficient: ±100ppm/°C; Object  Type: Part; Design Item ID: R-91R-0402; Value: 91R; Composition: Thick Film; Features: Moisture Resistant; Operating Temperature: -55°C ~ 155°C; Height - Seated (Max): 0.40mm; Category: Resistor
footprint R0402
pins: 1, 2

## R-91R-0603
designator R?, comment Package: 0603  (hidden comment: 91R)
RES SMD 91 OHM 1% 1/10W 0603; Manufacturer Part Number: CRCW060391R0FKEA; Manufacturer: Vishay Dale; Tolerance: 0.01; Power: 0.1W; Temperature Coefficient: ±100ppm/°C; Object  Type: Part; Design Item ID: R-91R-0603; Value: 91R; Composition: Thick Film; Features: Automotive AEC-Q200; Operating Temperature: -55°C ~ 155°C; Height - Seated (Max): 0.50mm; Category: Resistor
footprint R0603
pins: 1, 2

## R-93.1K-0402
designator R?, comment Package: 0402  (hidden comment: 93.1K)
RES 93.1K OHM 1% 1/16W 0402; Manufacturer Part Number: RC0402FR-0793K1L; Manufacturer: YAGEO; Tolerance: 0.01; Power: 0.063W; Temperature Coefficient: ±100ppm/°C; Object  Type: Part; Design Item ID: R-93.1K-0402; Value: 93.1K; Composition: Thick Film; Features: Moisture Resistant; Operating Temperature: -55°C ~ 155°C; Height - Seated (Max): 0.40mm; Category: Resistor
footprint R0402
pins: 1, 2

## R-93.1K-0603
designator R?, comment Package: 0603  (hidden comment: 93.1K)
RES SMD 93.1K OHM 1% 1/10W 0603; Manufacturer Part Number: CRCW060393K1FKEA; Manufacturer: Vishay Dale; Tolerance: 0.01; Power: 0.1W; Temperature Coefficient: ±100ppm/°C; Object  Type: Part; Design Item ID: R-93.1K-0603; Value: 93.1K; Composition: Thick Film; Features: Automotive AEC-Q200; Operating Temperature: -55°C ~ 155°C; Height - Seated (Max): 0.50mm; Category: Resistor
footprint R0603
pins: 1, 2

## R-93.1R-0402
designator R?, comment Package: 0402  (hidden comment: 93.1R)
RES 93.1 OHM 1% 1/16W 0402; Manufacturer Part Number: RC0402FR-0793R1L; Manufacturer: YAGEO; Tolerance: 0.01; Power: 0.063W; Temperature Coefficient: ±100ppm/°C; Object  Type: Part; Design Item ID: R-93.1R-0402; Value: 93.1R; Composition: Thick Film; Features: Moisture Resistant; Operating Temperature: -55°C ~ 155°C; Height - Seated (Max): 0.40mm; Category: Resistor
footprint R0402
pins: 1, 2

## R-93.1R-0603
designator R?, comment Package: 0603  (hidden comment: 93.1R)
RES SMD 93.1 OHM 1% 1/10W 0603; Manufacturer Part Number: CRCW060393R1FKEA; Manufacturer: Vishay Dale; Tolerance: 0.01; Power: 0.1W; Temperature Coefficient: ±100ppm/°C; Object  Type: Part; Design Item ID: R-93.1R-0603; Value: 93.1R; Composition: Thick Film; Features: Automotive AEC-Q200; Operating Temperature: -55°C ~ 155°C; Height - Seated (Max): 0.50mm; Category: Resistor
footprint R0603
pins: 1, 2

## R-95.3K-0402
designator R?, comment Package: 0402  (hidden comment: 95.3K)
RES 95.3K OHM 1% 1/16W 0402; Manufacturer Part Number: RC0402FR-0795K3L; Manufacturer: YAGEO; Tolerance: 0.01; Power: 0.063W; Temperature Coefficient: ±100ppm/°C; Object  Type: Part; Design Item ID: R-95.3K-0402; Value: 95.3K; Composition: Thick Film; Features: Moisture Resistant; Operating Temperature: -55°C ~ 155°C; Height - Seated (Max): 0.40mm; Category: Resistor
footprint R0402
pins: 1, 2

## R-95.3K-0603
designator R?, comment Package: 0603  (hidden comment: 95.3K)
RES SMD 95.3K OHM 1% 1/10W 0603; Manufacturer Part Number: CRCW060395K3FKEA; Manufacturer: Vishay Dale; Tolerance: 0.01; Power: 0.1W; Temperature Coefficient: ±100ppm/°C; Object  Type: Part; Design Item ID: R-95.3K-0603; Value: 95.3K; Composition: Thick Film; Features: Automotive AEC-Q200; Operating Temperature: -55°C ~ 155°C; Height - Seated (Max): 0.50mm; Category: Resistor
footprint R0603
pins: 1, 2

## R-95.3R-0402
designator R?, comment Package: 0402  (hidden comment: 95.3R)
RES 95.3 OHM 1% 1/16W 0402; Manufacturer Part Number: RC0402FR-0795R3L; Manufacturer: YAGEO; Tolerance: 0.01; Power: 0.063W; Temperature Coefficient: ±100ppm/°C; Object  Type: Part; Design Item ID: R-95.3R-0402; Value: 95.3R; Composition: Thick Film; Features: Moisture Resistant; Operating Temperature: -55°C ~ 155°C; Height - Seated (Max): 0.40mm; Category: Resistor
footprint R0402
pins: 1, 2

## R-95.3R-0603
designator R?, comment Package: 0603  (hidden comment: 95.3R)
RES SMD 95.3 OHM 1% 1/10W 0603; Manufacturer Part Number: CRCW060395R3FKEA; Manufacturer: Vishay Dale; Tolerance: 0.01; Power: 0.1W; Temperature Coefficient: ±100ppm/°C; Object  Type: Part; Design Item ID: R-95.3R-0603; Value: 95.3R; Composition: Thick Film; Features: Automotive AEC-Q200; Operating Temperature: -55°C ~ 155°C; Height - Seated (Max): 0.50mm; Category: Resistor
footprint R0603
pins: 1, 2

## R-97.6K-0402
designator R?, comment Package: 0402  (hidden comment: 97.6K)
RES 97.6K OHM 1% 1/16W 0402; Manufacturer Part Number: RC0402FR-0797K6L; Manufacturer: YAGEO; Tolerance: 0.01; Power: 0.063W; Temperature Coefficient: ±100ppm/°C; Object  Type: Part; Design Item ID: R-97.6K-0402; Value: 97.6K; Composition: Thick Film; Features: Moisture Resistant; Operating Temperature: -55°C ~ 155°C; Height - Seated (Max): 0.40mm; Category: Resistor
footprint R0402
pins: 1, 2

## R-97.6K-0603
designator R?, comment Package: 0603  (hidden comment: 97.6K)
RES SMD 97.6K OHM 1% 1/10W 0603; Manufacturer Part Number: CRCW060397K6FKEA; Manufacturer: Vishay Dale; Tolerance: 0.01; Power: 0.1W; Temperature Coefficient: ±100ppm/°C; Object  Type: Part; Design Item ID: R-97.6K-0603; Value: 97.6K; Composition: Thick Film; Features: Automotive AEC-Q200; Operating Temperature: -55°C ~ 155°C; Height - Seated (Max): 0.50mm; Category: Resistor
footprint R0603
pins: 1, 2

## R-97.6R-0402
designator R?, comment Package: 0402  (hidden comment: 97.6R)
RES 97.6 OHM 1% 1/16W 0402; Manufacturer Part Number: RC0402FR-0797R6L; Manufacturer: YAGEO; Tolerance: 0.01; Power: 0.063W; Temperature Coefficient: ±100ppm/°C; Object  Type: Part; Design Item ID: R-97.6R-0402; Value: 97.6R; Composition: Thick Film; Features: Moisture Resistant; Operating Temperature: -55°C ~ 155°C; Height - Seated (Max): 0.40mm; Category: Resistor
footprint R0402
pins: 1, 2

## R-97.6R-0603
designator R?, comment Package: 0603  (hidden comment: 97.6R)
RES SMD 97.6 OHM 1% 1/10W 0603; Manufacturer Part Number: CRCW060397R6FKEA; Manufacturer: Vishay Dale; Tolerance: 0.01; Power: 0.1W; Temperature Coefficient: ±100ppm/°C; Object  Type: Part; Design Item ID: R-97.6R-0603; Value: 97.6R; Composition: Thick Film; Features: Automotive AEC-Q200; Operating Temperature: -55°C ~ 155°C; Height - Seated (Max): 0.50mm; Category: Resistor
footprint R0603
pins: 1, 2

## R-100K-0402
designator R?, comment Package: 0402  (hidden comment: 100K)
RES 100K OHM 1% 1/16W 0402; Manufacturer Part Number: RC0402FR-07100KL; Manufacturer: YAGEO; Tolerance: 0.01; Power: 0.063W; Temperature Coefficient: ±100ppm/°C; Object  Type: Part; Design Item ID: R-100K-0402; Value: 100K; Composition: Thick Film; Features: Moisture Resistant; Operating Temperature: -55°C ~ 155°C; Height - Seated (Max): 0.40mm; Category: Resistor
footprint R0402
pins: 1, 2

## R-100K-0603
designator R?, comment Package: 0603  (hidden comment: 100K)
RES SMD 100K OHM 1% 1/10W 0603; Manufacturer Part Number: CRCW0603100KFKEA; Manufacturer: Vishay Dale; Tolerance: 0.01; Power: 0.1W; Temperature Coefficient: ±100ppm/°C; Object  Type: Part; Design Item ID: R-100K-0603; Value: 100K; Composition: Thick Film; Features: Automotive AEC-Q200; Operating Temperature: -55°C ~ 155°C; Height - Seated (Max): 0.50mm; Category: Resistor
footprint R0603
pins: 1, 2

## R-100mR-1206
designator R?, comment Package: 1206  (hidden comment: 100mR)
RES 0.1 OHM 1% 1/4W 1206; Manufacturer Part Number: WSL1206R1000FEA; Manufacturer: Vishay Dale; Tolerance: 0.01; Power: 0.25W; Temperature Coefficient: ±75ppm/°C; Object  Type: Part; Design Item ID: R-100mR-1206; Value: 100mR; Composition: Metal Element; Features: Anti-Sulfur, Automotive AEC-Q200, Current Sense, Moisture Resistant, Pulse Withstanding; Operating Temperature: -65°C ~ 170°C; Height - Seated (Max): 0.89mm; Category: Resistor
footprint R1206
pins: 1, 2

## R-100mR-2512
designator R?, comment Package: 2512  (hidden comment: 100mR)
RES 0.1 OHM 1% 1W 2512; Manufacturer Part Number: WSL2512R1000FEA; Manufacturer: Vishay Dale; Tolerance: 0.01; Temperature Coefficient: ±75ppm/°C; Object  Type: Part; Design Item ID: R-100mR-2512; Value: 100mR; Power: 1W; Composition: Metal Element; Features: Anti-Sulfur, Automotive AEC-Q200, Current Sense, Moisture Resistant, Pulse Withstanding; Operating Temperature: -65°C ~ 170°C; Height - Seated (Max): 0.89mm; Category: Resistor
footprint R2512
pins: 1, 2